# Altium footprint library Generic Footprint.PcbLib: 160 footprints (part 16 of 20) (continued)
## Symbol_FCC-Logo-6x4mm_Silkscreen [mil] (continued)
1(1.49,103.8) 1(1.49,104.07) 1(1.49,104.33) 1(1.49,104.6) 1(1.49,104.87) 1(1.49,105.14) 1(1.49,105.4) 1(1.49,105.67) 1(1.49,105.94) 1(1.49,106.21) 1(1.49,106.48) 1(1.49,106.74) 1(1.49,107.01) 1(1.49,107.28) 1(1.49,107.55) 1(1.49,107.81) 1(1.49,108.08) 1(1.49,108.35) 1(1.49,108.62) 1(1.49,108.88) 1(1.49,109.15) 1(1.49,109.42) 1(1.49,109.69) 1(1.49,109.96) 1(1.49,110.22) 1(1.49,110.49) 1(1.49,110.76) 1(1.49,111.03) 1(1.49,111.29) 1(1.49,111.56) 1(1.49,111.83) 1(1.49,112.1) 1(1.49,112.36) 1(1.49,112.63) 1(1.49,112.9) 1(1.49,113.17) 1(1.49,113.44) 1(1.49,113.7) 1(1.49,113.97) 1(1.49,114.24) 1(1.49,114.51) 1(1.49,114.77) 1(1.49,115.04) 1(1.49,115.31) 1(1.49,115.58) 1(1.49,115.85) 1(1.49,116.11) 1(1.49,116.38) 1(1.49,116.65) 1(1.49,116.92) 1(1.49,117.18) 1(1.49,117.45) 1(1.49,117.72) 1(1.49,117.99) 1(1.49,118.25) 1(1.49,118.52) 1(1.49,118.79) 1(1.49,119.06) 1(1.49,119.33) 1(1.49,119.59) 1(1.49,119.86) 1(1.49,120.13) 1(1.49,120.4) 1(1.49,120.66) 1(1.49,120.93) 1(1.49,121.2) 1(1.49,121.47) 1(1.49,121.74) 1(1.49,122) 1(1.49,122.27) 1(1.49,122.54) 1(1.49,122.81) 1(1.49,123.07) 1(1.49,123.34) 1(1.49,123.61) 1(1.49,123.88) 1(1.49,124.14) 1(1.49,124.41) 1(1.49,124.68) 1(1.49,124.95) 1(1.49,125.22) 1(1.49,125.48) 1(1.49,125.75) 1(1.49,126.02) 1(1.49,126.29) 1(1.49,126.55) 1(1.49,126.82) 1(1.49,127.09) 1(1.49,127.36) 1(1.49,127.62) 1(1.49,127.89) 1(1.49,128.16) 1(1.49,128.43) 1(1.49,128.7) 1(1.49,128.96) 1(1.49,129.23) 1(1.49,129.5) 1(1.49,129.77) 1(1.49,130.03) 1(1.49,130.3) 1(1.49,130.57) 1(1.49,130.84) 1(1.49,131.11) 1(1.49,131.37) 1(1.49,131.64) 1(1.49,131.91) 1(1.49,132.18) 1(1.49,132.44) 1(1.49,132.71) 1(1.49,132.98) 1(1.49,133.25) 1(1.49,133.51) 1(1.49,133.78) 1(1.49,134.05) 1(1.49,134.32) 1(1.49,134.59) 1(1.49,134.85) 1(1.49,135.12) 1(1.49,135.39) 1(1.49,135.66) 1(1.49,135.92) 1(1.49,136.19) 1(1.49,136.46) 1(1.49,136.73) 1(1.49,136.99) 1(1.49,137.26) 1(1.49,137.53) 1(1.49,137.8) 1(1.49,138.07) 1(1.49,138.33) 1(1.49,138.6) 1(1.49,138.87) 1(1.49,139.14) 1(1.49,139.4) 1(1.49,139.67) 1(1.49,139.94) 1(1.49,140.21) 1(1.49,140.48) 1(1.49,140.74) 1(1.49,141.01) 1(1.49,141.28) 1(1.49,141.55) 1(1.49,141.81) 1(1.49,142.08) 1(1.49,142.35) 1(1.49,142.62) 1(1.49,142.88) 1(1.49,143.15) 1(1.49,143.42) 1(1.49,143.96) 1(1.49,144.22) 1(1.49,144.49) 1(1.49,144.76) 1(1.49,145.03) 1(1.49,145.29) 1(1.49,145.56) 1(1.49,145.83) 1(1.75,2.87) 1(1.75,3.14) 1(1.75,3.4) 1(1.75,3.94) 1(1.75,144.22) 1(1.75,144.49) 1(1.75,144.76) 1(1.75,145.03) 1(1.75,145.29) 1(1.75,145.56) 1(1.75,145.83) 1(1.75,146.36) 1(1.75,146.63) 1(1.75,146.9) 1(2.02,3.14) 1(2.02,3.4) 1(2.02,3.67) 1(2.02,145.29) 1(2.02,145.56) 1(2.02,145.83) 1(2.02,146.1) 1(2.02,146.36) 1(2.02,146.63) 1(2.02,146.9) 1(2.02,147.44) 1(2.02,148.24) 1(2.29,2.6) 1(2.29,2.87) 1(2.29,146.36) 1(2.29,146.63) 1(2.29,146.9) 1(2.29,147.17) 1(2.29,147.44) 1(2.29,147.97) 1(2.56,2.33) 1(2.56,2.6) 1(2.56,2.87) 1(2.56,148.24) 1(2.56,148.77) 1(2.56,149.04) 1(2.56,149.31) 1(2.83,147.44) 1(2.83,147.7) 1(2.83,149.58) 1(3.09,2.07) 1(3.09,148.24) 1(3.09,148.51) 1(3.09,149.85) 1(3.09,150.11) 1(3.09,150.38) 1(3.09,150.65) 1(3.36,2.33) 1(3.36,2.6) 1(3.36,150.11) 1(3.36,150.38) 1(3.36,150.65) 1(3.36,151.18) 1(3.63,1.8) 1(3.63,150.11) 1(3.63,150.38) 1(3.63,150.65) 1(3.63,151.18) 1(3.9,2.07) 1(3.9,2.33) 1(4.16,150.92) 1(4.16,151.18) 1(4.16,152.25) 1(4.43,1.53) 1(4.43,151.45) 1(4.43,151.72) 1(4.43,151.99) 1(4.43,152.25) 1(4.43,152.79) 1(4.43,153.06) 1(4.43,153.33) 1(4.43,153.59) 1(4.7,1.26) 1(4.7,1.8) 1(4.7,2.07) 1(4.7,152.25) 1(4.7,152.52) 1(4.7,152.79) 1(4.7,153.06) 1(4.7,153.86) 1(4.97,152.79) 1(4.97,153.06) 1(4.97,153.59) 1(4.97,153.86) 1(4.97,154.13) 1(5.24,153.59) 1(5.24,153.86) 1(5.24,154.4) 1(5.5,154.66) 1(5.5,154.93) 1(5.77,154.93) 1(5.77,155.2) 1(6.04,154.93) 1(6.04,155.2) 1(6.04,155.74) 1(6.04,156) 1(6.31,155.2) 1(6.31,155.74) 1(6.31,156) 1(6.31,156.54) 1(6.57,155.47) 1(6.57,156.27) 1(6.57,156.81) 1(6.84,155.74) 1(6.84,156) 1(6.84,156.27) 1(6.84,156.54) 1(7.11,156.27) 1(7.11,156.54) 1(7.11,157.07) 1(7.11,157.34) 1(7.11,157.61) 1(7.38,157.88) 1(7.64,158.14) 1(8.18,158.68) 1(8.18,158.95) 1(8.45,158.68) 1(8.45,158.95) 1(8.45,159.22) 1(8.72,158.41) 1(8.72,158.68) 1(8.72,159.22) 1(8.72,159.48) 1(8.98,158.95) 1(8.98,159.48) 1(8.98,159.75) 1(9.25,159.22) 1(9.25,159.48) 1(9.25,160.02) 1(9.52,159.75) 1(9.52,160.29) 1(9.79,159.75) 1(9.79,160.55) 1(10.05,160.82) 1(10.32,160.55) 1(10.32,161.09) 1(10.59,160.55) 1(10.59,160.82) 1(10.59,161.36) 1(10.86,160.82) 1(10.86,161.09) 1(10.86,161.62) 1(11.12,161.09) 1(11.12,161.36) 1(11.12,161.62) 1(11.12,161.89) 1(11.39,161.36) 1(11.39,161.89) 1(11.39,162.16) 1(11.66,161.62) 1(11.66,162.43) 1(11.93,161.89) 1(12.2,162.7) 1(12.46,162.96) 1(12.73,163.23) 1(13,162.96) 1(13.27,163.5) 1(13.53,162.96) 1(13.53,163.77) 1(13.8,164.03) 1(14.07,163.77) 1(14.07,164.03) 1(14.07,164.3) 1(14.61,163.77) 1(14.61,164.3) 1(14.61,164.57) 1(14.87,164.03) 1(15.41,164.3) 1(15.41,164.84) 1(15.68,165.11) 1(15.94,165.37) 1(16.75,165.11) 1(16.75,165.37) 1(16.75,165.64) 1(17.28,165.11) 1(17.28,165.37) 1(17.55,165.64) 1(17.55,165.91) 1(18.09,165.64) 1(18.09,165.91) 1(18.09,166.18) 1(19.16,165.91) 1(19.16,166.18) 1(19.16,166.44) 1(19.96,166.71) 1(20.23,166.18) 1(20.23,166.98) 1(20.49,166.44) 1(21.83,166.44) 1(22.1,167.25) 1(27.46,1.53) 1(27.46,2.6) 1(27.46,2.87) 1(27.46,3.14) 1(27.46,3.4) 1(27.46,3.67) 1(27.46,3.94) 1(27.46,4.21) 1(27.46,4.48) 1(27.46,4.74) 1(27.46,5.01) 1(27.46,5.28) 1(27.46,5.55) 1(27.46,5.81) 1(27.46,6.08) 1(27.46,6.35) 1(27.46,6.62) 1(27.46,6.88) 1(27.46,7.15) 1(27.46,7.42) 1(27.46,7.69) 1(27.46,7.96) 1(27.46,8.22) 1(27.46,8.49) 1(27.46,8.76) 1(27.46,9.03) 1(27.46,9.29) 1(27.46,9.56) 1(27.46,9.83) 1(27.46,10.1) 1(27.46,10.36) 1(27.46,10.63) 1(27.46,10.9) 1(27.46,11.17) 1(27.46,11.44) 1(27.46,11.7) 1(27.46,11.97) 1(27.46,12.24) 1(27.46,12.51) 1(27.46,12.77) 1(27.46,13.04) 1(27.46,13.31) 1(27.46,13.58) 1(27.46,13.85) 1(27.46,14.11) 1(27.46,14.38) 1(27.46,14.65) 1(27.46,14.92) 1(27.46,15.18) 1(27.46,15.45) 1(27.46,15.72) 1(27.46,15.99) 1(27.46,16.25) 1(27.46,16.52) 1(27.46,16.79) 1(27.46,17.06) 1(27.46,17.33) 1(27.46,17.59) 1(27.46,17.86) 1(27.46,18.13) 1(27.46,18.4) 1(27.46,18.66) 1(27.46,18.93) 1(27.46,19.2) 1(27.46,19.47) 1(27.46,19.73) 1(27.46,20) 1(27.46,20.27) 1(27.46,20.54) 1(27.46,20.81) 1(27.46,21.07) 1(27.46,21.34) 1(27.46,21.61) 1(27.46,21.88) 1(27.46,22.14) 1(27.46,22.41) 1(27.46,22.68) 1(27.46,22.95) 1(27.46,23.22) 1(27.46,23.48) 1(27.46,23.75) 1(27.46,24.02) 1(27.46,24.29) 1(27.46,24.55) 1(27.46,24.82) 1(27.46,25.09) 1(27.46,25.36) 1(27.46,25.62) 1(27.46,25.89) 1(27.46,26.16) 1(27.46,26.43) 1(27.46,26.7) 1(27.46,26.96) 1(27.46,27.23) 1(27.46,27.5) 1(27.46,27.77) 1(27.46,28.03) 1(27.46,28.3) 1(27.46,28.57) 1(27.46,28.84) 1(27.46,29.11) 1(27.46,29.37) 1(27.46,29.64) 1(27.46,29.91) 1(27.46,30.18) 1(27.46,30.44) 1(27.46,30.71) 1(27.46,30.98) 1(27.46,31.25) 1(27.46,31.51) 1(27.46,31.78) 1(27.46,32.05) 1(27.46,32.32) 1(27.46,32.59) 1(27.46,32.85) 1(27.46,33.12) 1(27.46,33.39) 1(27.46,33.66) 1(27.46,33.92) 1(27.46,34.19) 1(27.46,34.46) 1(27.46,34.73) 1(27.46,34.99) 1(27.46,35.26) 1(27.46,35.53) 1(27.46,35.8) 1(27.46,36.07) 1(27.46,36.33) 1(27.46,36.6) 1(27.46,36.87) 1(27.46,37.14) 1(27.46,37.4) 1(27.46,37.67) 1(27.46,37.94) 1(27.46,38.21) 1(27.46,38.48) 1(27.46,38.74) 1(27.46,39.01) 1(27.46,39.28) 1(27.46,39.55) 1(27.46,39.81) 1(27.46,40.08) 1(27.46,40.35) 1(27.46,40.62) 1(27.46,40.88) 1(27.46,41.15) 1(27.46,41.42) 1(27.46,41.69) 1(27.46,41.96) 1(27.46,42.22) 1(27.46,42.49) 1(27.46,42.76) 1(27.46,43.03) 1(27.46,43.29) 1(27.46,43.56) 1(27.46,43.83) 1(27.46,44.1) 1(27.46,44.36) 1(27.46,44.63) 1(27.46,44.9) 1(27.46,45.17) 1(27.46,45.44) 1(27.46,45.7) 1(27.46,45.97) 1(27.46,46.24) 1(27.46,46.51) 1(27.46,46.77) 1(27.46,47.04) 1(27.46,47.31) 1(27.46,47.58) 1(27.46,47.85) 1(27.46,48.11) 1(27.46,48.38) 1(27.46,48.65) 1(27.46,48.92) 1(27.46,49.18) 1(27.46,49.45) 1(27.46,49.72) 1(27.46,49.99) 1(27.46,50.25) 1(27.46,50.52) 1(27.46,50.79) 1(27.46,51.06) 1(27.46,51.33) 1(27.46,51.59) 1(27.46,51.86) 1(27.46,52.13) 1(27.46,52.4) 1(27.46,52.66) 1(27.46,52.93) 1(27.46,53.2) 1(27.46,53.47) 1(27.46,53.73) 1(27.46,54) 1(27.46,54.27) 1(27.46,54.54) 1(27.46,54.81) 1(27.46,55.07) 1(27.46,55.34) 1(27.46,55.61) 1(27.46,55.88) 1(27.46,56.14) 1(27.46,56.41) 1(27.46,56.68) 1(27.46,56.95) 1(27.46,57.22) 1(27.46,57.48) 1(27.46,57.75) 1(27.46,58.02) 1(27.46,58.29) 1(27.46,58.55) 1(27.46,58.82) 1(27.46,59.09) 1(27.46,59.36) 1(27.46,59.62) 1(27.46,59.89) 1(27.46,60.16) 1(27.46,60.43) 1(27.46,60.7) 1(27.46,60.96) 1(27.46,61.23) 1(27.46,61.5) 1(27.46,61.77) 1(27.46,62.03) 1(27.46,62.3) 1(27.46,62.57) 1(27.46,62.84) 1(27.46,63.11) 1(27.46,63.37) 1(27.46,63.64) 1(27.46,63.91) 1(27.46,64.18) 1(27.46,64.44) 1(27.46,64.71) 1(27.46,64.98) 1(27.46,65.25) 1(27.46,65.51) 1(27.46,65.78) 1(27.46,66.05) 1(27.46,66.32) 1(27.46,66.59) 1(27.46,66.85) 1(27.46,67.12) 1(27.46,67.39) 1(27.46,67.66) 1(27.46,67.92) 1(27.46,68.19) 1(27.46,68.46) 1(27.46,68.73) 1(27.46,68.99) 1(27.46,69.26) 1(27.46,69.53) 1(27.46,69.8) 1(27.46,70.33) 1(27.46,134.85) 1(27.46,135.12) 1(27.72,1.26) 1(27.72,2.6) 1(27.72,2.87) 1(27.72,3.14) 1(27.72,3.4) 1(27.72,3.67) 1(27.72,3.94) 1(27.72,4.21) 1(27.72,4.48) 1(27.72,4.74) 1(27.72,5.01) 1(27.72,5.28) 1(27.72,5.55) 1(27.72,5.81) 1(27.72,6.08) 1(27.72,6.35) 1(27.72,6.62) 1(27.72,6.88) 1(27.72,7.15) 1(27.72,7.42) 1(27.72,7.69) 1(27.72,7.96) 1(27.72,8.22) 1(27.72,8.49) 1(27.72,8.76) 1(27.72,9.03) 1(27.72,9.29) 1(27.72,9.56) 1(27.72,9.83) 1(27.72,10.1) 1(27.72,10.36) 1(27.72,10.63) 1(27.72,10.9) 1(27.72,11.17) 1(27.72,11.44) 1(27.72,11.7) 1(27.72,11.97) 1(27.72,12.24) 1(27.72,12.51) 1(27.72,12.77) 1(27.72,13.04) 1(27.72,13.31) 1(27.72,13.58) 1(27.72,13.85) 1(27.72,14.11) 1(27.72,14.38) 1(27.72,14.65) 1(27.72,14.92) 1(27.72,15.18) 1(27.72,15.45) 1(27.72,15.72) 1(27.72,15.99) 1(27.72,16.25) 1(27.72,16.52) 1(27.72,16.79) 1(27.72,17.06) 1(27.72,17.33) 1(27.72,17.59) 1(27.72,17.86) 1(27.72,18.13) 1(27.72,18.4) 1(27.72,18.66) 1(27.72,18.93) 1(27.72,19.2) 1(27.72,19.47) 1(27.72,19.73) 1(27.72,20) 1(27.72,20.27) 1(27.72,20.54) 1(27.72,20.81) 1(27.72,21.07) 1(27.72,21.34) 1(27.72,21.61) 1(27.72,21.88) 1(27.72,22.14) 1(27.72,22.41) 1(27.72,22.68) 1(27.72,22.95) 1(27.72,23.22) 1(27.72,23.48) 1(27.72,23.75) 1(27.72,24.02) 1(27.72,24.29) 1(27.72,24.55) 1(27.72,24.82) 1(27.72,25.09) 1(27.72,25.36) 1(27.72,25.62) 1(27.72,25.89) 1(27.72,26.16) 1(27.72,26.43) 1(27.72,26.7) 1(27.72,26.96) 1(27.72,27.23) 1(27.72,27.5) 1(27.72,27.77) 1(27.72,28.03) 1(27.72,28.3) 1(27.72,28.57) 1(27.72,28.84) 1(27.72,29.11) 1(27.72,29.37) 1(27.72,29.64) 1(27.72,29.91) 1(27.72,30.18) 1(27.72,30.44) 1(27.72,30.71) 1(27.72,30.98) 1(27.72,31.25) 1(27.72,31.51) 1(27.72,31.78) 1(27.72,32.05) 1(27.72,32.32) 1(27.72,32.59) 1(27.72,32.85) 1(27.72,33.12) 1(27.72,33.39) 1(27.72,33.66) 1(27.72,33.92) 1(27.72,34.19) 1(27.72,34.46) 1(27.72,34.73) 1(27.72,34.99) 1(27.72,35.26) 1(27.72,35.53) 1(27.72,35.8) 1(27.72,36.07) 1(27.72,36.33) 1(27.72,36.6) 1(27.72,36.87) 1(27.72,37.14) 1(27.72,37.4) 1(27.72,37.67) 1(27.72,37.94) 1(27.72,38.21) 1(27.72,38.48) 1(27.72,38.74) 1(27.72,39.01) 1(27.72,39.28) 1(27.72,39.55) 1(27.72,39.81) 1(27.72,40.08) 1(27.72,40.35) 1(27.72,40.62) 1(27.72,40.88) 1(27.72,41.15) 1(27.72,41.42) 1(27.72,41.69) 1(27.72,41.96) 1(27.72,42.22) 1(27.72,42.49) 1(27.72,42.76) 1(27.72,43.03) 1(27.72,43.29) 1(27.72,43.56) 1(27.72,43.83) 1(27.72,44.1) 1(27.72,44.36) 1(27.72,44.63) 1(27.72,44.9) 1(27.72,45.17) 1(27.72,45.44) 1(27.72,45.7) 1(27.72,45.97) 1(27.72,46.24) 1(27.72,46.51) 1(27.72,46.77) 1(27.72,47.04) 1(27.72,47.31) 1(27.72,47.58) 1(27.72,47.85) 1(27.72,48.11) 1(27.72,48.38) 1(27.72,48.65) 1(27.72,48.92) 1(27.72,49.18) 1(27.72,49.45) 1(27.72,49.72) 1(27.72,49.99) 1(27.72,50.25) 1(27.72,50.52) 1(27.72,50.79) 1(27.72,51.06) 1(27.72,51.33) 1(27.72,51.59) 1(27.72,51.86) 1(27.72,52.13) 1(27.72,52.4) 1(27.72,52.66) 1(27.72,52.93) 1(27.72,53.2) 1(27.72,53.47) 1(27.72,53.73) 1(27.72,54) 1(27.72,54.27) 1(27.72,54.54) 1(27.72,54.81) 1(27.72,55.07) 1(27.72,55.34) 1(27.72,55.61) 1(27.72,55.88) 1(27.72,56.14) 1(27.72,56.41) 1(27.72,56.68) 1(27.72,56.95) 1(27.72,57.22) 1(27.72,57.48) 1(27.72,57.75) 1(27.72,58.02) 1(27.72,58.29) 1(27.72,58.55) 1(27.72,58.82) 1(27.72,59.09) 1(27.72,59.36) 1(27.72,59.62) 1(27.72,59.89) 1(27.72,60.16) 1(27.72,60.43) 1(27.72,60.7) 1(27.72,60.96) 1(27.72,61.23) 1(27.72,61.5) 1(27.72,61.77) 1(27.72,62.03) 1(27.72,62.3) 1(27.72,62.57) 1(27.72,62.84) 1(27.72,63.11) 1(27.72,63.37) 1(27.72,63.64) 1(27.72,63.91) 1(27.72,64.18) 1(27.72,64.44) 1(27.72,64.71) 1(27.72,64.98) 1(27.72,65.25) 1(27.72,65.51) 1(27.72,65.78) 1(27.72,66.05) 1(27.72,66.32) 1(27.72,66.59) 1(27.72,66.85) 1(27.72,67.12) 1(27.72,67.39) 1(27.72,67.66) 1(27.72,67.92) 1(27.72,68.19) 1(27.72,68.46) 1(27.72,68.73) 1(27.72,68.99) 1(27.72,69.26) 1(27.72,69.53) 1(27.72,69.8) 1(27.72,70.33) 1(27.72,71.14) 1(27.72,134.85) 1(27.72,135.12) 1(27.72,135.39) 1(27.72,135.66) 1(27.99,1.8) 1(27.99,2.07) 1(27.99,70.87) 1(27.99,92.82) 1(27.99,93.09) 1(27.99,93.36) 1(27.99,93.62) 1(27.99,93.89) 1(27.99,94.16) 1(27.99,94.43) 1(27.99,94.7) 1(27.99,94.96) 1(27.99,95.23) 1(27.99,95.5) 1(27.99,95.77) 1(27.99,96.03) 1(27.99,96.3) 1(27.99,96.57) 1(27.99,96.84) 1(27.99,97.11) 1(27.99,97.37) 1(27.99,97.64) 1(27.99,97.91) 1(27.99,98.18) 1(27.99,98.44) 1(27.99,98.71) 1(27.99,98.98) 1(27.99,99.25) 1(27.99,99.51) 1(27.99,99.78) 1(27.99,100.05) 1(27.99,100.32) 1(27.99,100.59) 1(27.99,100.85) 1(27.99,101.12) 1(27.99,101.39) 1(27.99,101.66) 1(27.99,101.92) 1(27.99,102.19) 1(27.99,102.46) 1(27.99,102.73) 1(27.99,102.99) 1(27.99,103.26) 1(27.99,103.53) 1(27.99,103.8) 1(27.99,104.07) 1(27.99,104.33) 1(27.99,104.6) 1(27.99,104.87) 1(27.99,105.14) 1(27.99,105.4) 1(27.99,105.67) 1(27.99,105.94) 1(27.99,106.21) 1(27.99,106.48) 1(27.99,106.74) 1(27.99,107.01) 1(27.99,107.28) 1(27.99,107.55) 1(27.99,107.81) 1(27.99,108.08) 1(27.99,108.35) 1(27.99,108.62) 1(27.99,108.88) 1(27.99,109.15) 1(27.99,109.42) 1(27.99,109.69) 1(27.99,109.96) 1(27.99,110.22) 1(27.99,110.49) 1(27.99,110.76) 1(27.99,111.03) 1(27.99,111.29) 1(27.99,111.56) 1(27.99,111.83) 1(27.99,112.1) 1(27.99,112.36) 1(27.99,112.63) 1(27.99,112.9) 1(27.99,113.17) 1(27.99,113.44) 1(27.99,113.7) 1(27.99,113.97) 1(27.99,114.24) 1(27.99,114.51) 1(27.99,114.77) 1(27.99,115.04) 1(27.99,115.31) 1(27.99,115.58) 1(27.99,115.85) 1(27.99,116.11) 1(27.99,116.38) 1(27.99,116.65) 1(27.99,116.92) 1(27.99,117.18) 1(27.99,117.45) 1(27.99,117.72) 1(27.99,117.99) 1(27.99,118.25) 1(27.99,118.52) 1(27.99,118.79) 1(27.99,119.06) 1(27.99,119.33) 1(27.99,119.59) 1(27.99,119.86) 1(27.99,120.13) 1(27.99,120.4) 1(27.99,120.66) 1(27.99,120.93) 1(27.99,121.2) 1(27.99,121.47) 1(27.99,121.74) 1(27.99,122) 1(27.99,122.27) 1(27.99,122.54) 1(27.99,122.81) 1(27.99,123.07) 1(27.99,123.34) 1(27.99,123.61) 1(27.99,123.88) 1(27.99,124.14) 1(27.99,124.41) 1(27.99,124.68) 1(27.99,124.95) 1(27.99,125.22) 1(27.99,125.48) 1(27.99,125.75) 1(27.99,126.02) 1(27.99,126.29) 1(27.99,126.55) 1(27.99,126.82) 1(27.99,127.09) 1(27.99,127.36) 1(27.99,127.62) 1(27.99,127.89) 1(27.99,128.16) 1(27.99,128.43) 1(27.99,128.7) 1(27.99,128.96) 1(27.99,129.23) 1(27.99,129.5) 1(27.99,129.77) 1(27.99,130.03) 1(27.99,130.3) 1(27.99,130.57) 1(27.99,130.84) 1(27.99,131.11) 1(27.99,131.37) 1(27.99,131.64) 1(27.99,131.91) 1(27.99,132.18) 1(27.99,132.44) 1(27.99,132.71) 1(27.99,132.98) 1(27.99,133.25) 1(27.99,133.51) 1(27.99,133.78) 1(27.99,134.05) 1(27.99,134.32) 1(27.99,134.59) 1(27.99,135.12) 1(28.26,1.8) 1(28.26,2.33) 1(28.26,2.6) 1(28.26,2.87) 1(28.26,3.14) 1(28.26,3.4) 1(28.26,3.67) 1(28.26,3.94) 1(28.26,4.21) 1(28.26,4.48) 1(28.26,4.74) 1(28.26,5.01) 1(28.26,5.28) 1(28.26,5.55) 1(28.26,5.81) 1(28.26,6.08) 1(28.26,6.35) 1(28.26,6.62) 1(28.26,6.88) 1(28.26,7.15) 1(28.26,7.42) 1(28.26,7.69) 1(28.26,7.96) 1(28.26,8.22) 1(28.26,8.49) 1(28.26,8.76) 1(28.26,9.03) 1(28.26,9.29) 1(28.26,9.56) 1(28.26,9.83) 1(28.26,10.1) 1(28.26,10.36) 1(28.26,10.63) 1(28.26,10.9) 1(28.26,11.17) 1(28.26,11.44) 1(28.26,11.7) 1(28.26,11.97) 1(28.26,12.24) 1(28.26,12.51) 1(28.26,12.77) 1(28.26,13.04) 1(28.26,13.31) 1(28.26,13.58) 1(28.26,13.85) 1(28.26,14.11) 1(28.26,14.38) 1(28.26,14.65) 1(28.26,14.92) 1(28.26,15.18) 1(28.26,15.45) 1(28.26,15.72) 1(28.26,15.99) 1(28.26,16.25) 1(28.26,16.52) 1(28.26,16.79) 1(28.26,17.06) 1(28.26,17.33) 1(28.26,17.59) 1(28.26,17.86) 1(28.26,18.13) 1(28.26,18.4) 1(28.26,18.66) 1(28.26,18.93) 1(28.26,19.2) 1(28.26,19.47) 1(28.26,19.73) 1(28.26,20) 1(28.26,20.27) 1(28.26,20.54) 1(28.26,20.81) 1(28.26,21.07) 1(28.26,21.34) 1(28.26,21.61) 1(28.26,21.88) 1(28.26,22.14) 1(28.26,22.41) 1(28.26,22.68) 1(28.26,22.95) 1(28.26,23.22) 1(28.26,23.48) 1(28.26,23.75) 1(28.26,24.02) 1(28.26,24.29) 1(28.26,24.55) 1(28.26,24.82) 1(28.26,25.09) 1(28.26,25.36) 1(28.26,25.62) 1(28.26,25.89) 1(28.26,26.16) 1(28.26,26.43) 1(28.26,26.7) 1(28.26,26.96) 1(28.26,27.23) 1(28.26,27.5) 1(28.26,27.77) 1(28.26,28.03) 1(28.26,28.3) 1(28.26,28.57) 1(28.26,28.84) 1(28.26,29.11) 1(28.26,29.37) 1(28.26,29.64) 1(28.26,29.91) 1(28.26,30.18) 1(28.26,30.44) 1(28.26,30.71) 1(28.26,30.98) 1(28.26,31.25) 1(28.26,31.51) 1(28.26,31.78) 1(28.26,32.05) 1(28.26,32.32) 1(28.26,32.59) 1(28.26,32.85) 1(28.26,33.12) 1(28.26,33.39) 1(28.26,33.66) 1(28.26,33.92) 1(28.26,34.19) 1(28.26,34.46) 1(28.26,34.73) 1(28.26,34.99) 1(28.26,35.26) 1(28.26,35.53) 1(28.26,35.8) 1(28.26,36.07) 1(28.26,36.33) 1(28.26,36.6) 1(28.26,36.87) 1(28.26,37.14) 1(28.26,37.4) 1(28.26,37.67) 1(28.26,37.94) 1(28.26,38.21) 1(28.26,38.48) 1(28.26,38.74) 1(28.26,39.01) 1(28.26,39.28) 1(28.26,39.55) 1(28.26,39.81) 1(28.26,40.08) 1(28.26,40.35) 1(28.26,40.62) 1(28.26,40.88) 1(28.26,41.15) 1(28.26,41.42) 1(28.26,41.69) 1(28.26,41.96) 1(28.26,42.22) 1(28.26,42.49) 1(28.26,42.76) 1(28.26,43.03) 1(28.26,43.29) 1(28.26,43.56) 1(28.26,43.83) 1(28.26,44.1) 1(28.26,44.36) 1(28.26,44.63) 1(28.26,44.9) 1(28.26,45.17) 1(28.26,45.44) 1(28.26,45.7) 1(28.26,45.97) 1(28.26,46.24) 1(28.26,46.51) 1(28.26,46.77) 1(28.26,47.04) 1(28.26,47.31) 1(28.26,47.58) 1(28.26,47.85) 1(28.26,48.11) 1(28.26,48.38) 1(28.26,48.65) 1(28.26,48.92) 1(28.26,49.18) 1(28.26,49.45) 1(28.26,49.72) 1(28.26,49.99) 1(28.26,50.25) 1(28.26,50.52) 1(28.26,50.79) 1(28.26,51.06) 1(28.26,51.33) 1(28.26,51.59) 1(28.26,51.86) 1(28.26,52.13) 1(28.26,52.4) 1(28.26,52.66) 1(28.26,52.93) 1(28.26,53.2) 1(28.26,53.47) 1(28.26,53.73) 1(28.26,54) 1(28.26,54.27) 1(28.26,54.54) 1(28.26,54.81) 1(28.26,55.07) 1(28.26,55.34) 1(28.26,55.61) 1(28.26,55.88) 1(28.26,56.14) 1(28.26,56.41) 1(28.26,56.68) 1(28.26,56.95) 1(28.26,57.22) 1(28.26,57.48) 1(28.26,57.75) 1(28.26,58.02) 1(28.26,58.29) 1(28.26,58.55) 1(28.26,58.82) 1(28.26,59.09) 1(28.26,59.36) 1(28.26,59.62) 1(28.26,59.89) 1(28.26,60.16) 1(28.26,60.43) 1(28.26,60.7) 1(28.26,60.96) 1(28.26,61.23) 1(28.26,61.5) 1(28.26,61.77) 1(28.26,62.03) 1(28.26,62.3) 1(28.26,62.57) 1(28.26,62.84) 1(28.26,63.11) 1(28.26,63.37) 1(28.26,63.64) 1(28.26,63.91) 1(28.26,64.18) 1(28.26,64.44) 1(28.26,64.71) 1(28.26,64.98) 1(28.26,65.25) 1(28.26,65.51) 1(28.26,65.78) 1(28.26,66.05) 1(28.26,66.32) 1(28.26,66.59) 1(28.26,66.85) 1(28.26,67.12) 1(28.26,67.39) 1(28.26,67.66) 1(28.26,67.92) 1(28.26,68.19) 1(28.26,68.46) 1(28.26,68.73) 1(28.26,68.99) 1(28.26,69.26) 1(28.26,69.53) 1(28.26,69.8) 1(28.26,70.07) 1(28.26,70.33) 1(28.26,70.6) 1(28.26,71.14) 1(28.26,92.29) 1(28.26,134.85) 1(28.26,135.12) 1(28.26,135.39) 1(28.26,135.66) 1(28.26,135.92) 1(28.26,136.19) 1(28.53,71.14) 1(28.53,71.4) 1(28.53,71.67) 1(28.53,92.29) 1(28.53,135.12) 1(28.53,135.39) 1(28.53,135.66) 1(28.53,136.46) 1(28.79,72.21) 1(28.79,92.02) 1(28.79,92.55) 1(28.79,136.19) 1(28.79,136.46) 1(28.79,136.99) 1(29.06,136.19) 1(29.06,136.46) 1(29.06,136.73) 1(29.06,136.99) 1(29.33,137.53) 1(29.6,136.99) 1(29.6,137.53) 1(29.6,137.8) 1(29.86,71.67) 1(29.86,71.94) 1(29.86,72.21) 1(29.86,137.26) 1(29.86,137.8) 1(30.13,138.07) 1(30.4,137.53) 1(30.4,138.07) 1(30.67,137.8) 1(30.94,138.07) 1(31.2,138.33) 1(31.2,138.87) 1(31.74,138.6) 1(31.74,138.87) 1(31.74,139.14) 1(32.27,138.87) 1(32.27,139.14) 1(32.27,139.4) 1(80.2,92.02) 1(80.2,92.55) 1(80.46,71.94) 1(80.73,69.53) 1(80.73,69.8) 1(80.73,70.07) 1(80.73,70.33) 1(80.73,70.6) 1(80.73,70.87) 1(80.73,71.14) 1(80.73,71.4) 1(80.73,92.55) 1(80.73,93.36) 1(80.73,93.62) 1(80.73,93.89) 1(80.73,94.16) 1(80.73,94.43) 1(80.73,94.7) 1(81,67.66) 1(81,67.92) 1(81,68.19) 1(81,68.46) 1(81,68.73) 1(81,68.99) 1(81,69.53) 1(81,69.8) 1(81,70.07) 1(81,70.33) 1(81,70.6) 1(81,70.87) 1(81,71.14) 1(81,92.55) 1(81,92.82) 1(81,93.36) 1(81,93.62) 1(81,93.89) 1(81,94.16) 1(81,94.43) 1(81,94.7) 1(81,95.23) 1(81,95.5) 1(81,95.77) 1(81,96.03) 1(81,96.3) 1(81.27,66.32) 1(81.27,66.59) 1(81.27,66.85) 1(81.27,67.12) 1(81.27,67.66) 1(81.27,67.92) 1(81.27,68.19) 1(81.27,68.46) 1(81.27,68.73) 1(81.27,68.99) 1(81.27,69.26) 1(81.27,69.53) 1(81.27,69.8) 1(81.27,70.07) 1(81.27,70.33) 1(81.27,70.6) 1(81.27,70.87) 1(81.27,71.14) 1(81.27,93.09) 1(81.27,93.36) 1(81.27,93.62) 1(81.27,93.89) 1(81.27,94.16) 1(81.27,94.43) 1(81.27,94.7) 1(81.27,94.96) 1(81.27,95.23) 1(81.27,95.5) 1(81.27,95.77) 1(81.27,96.03) 1(81.27,96.3) 1(81.27,96.84) 1(81.27,97.11) 1(81.27,97.37) 1(81.27,97.64) 1(81.27,97.91) 1(81.53,65.25) 1(81.53,65.78) 1(81.53,68.99) 1(81.53,95.23) 1(81.53,97.91) 1(81.53,98.18) 1(81.53,99.25) 1(81.8,63.64) 1(81.8,63.91) 1(81.8,64.18) 1(81.8,64.44) 1(81.8,64.71) 1(81.8,64.98) 1(81.8,65.51) 1(81.8,66.32) 1(81.8,66.59) 1(81.8,66.85) 1(81.8,67.12) 1(81.8,67.39) 1(81.8,67.66) 1(81.8,67.92) 1(81.8,68.19) 1(81.8,68.46) 1(81.8,68.73) 1(81.8,95.5) 1(81.8,95.77) 1(81.8,96.03) 1(81.8,96.3) 1(81.8,96.57) 1(81.8,96.84) 1(81.8,97.11) 1(81.8,97.37) 1(81.8,97.64) 1(81.8,98.18) 1(81.8,98.44) 1(81.8,98.71) 1(81.8,98.98) 1(81.8,99.51) 1(81.8,99.78) 1(81.8,100.05) 1(81.8,100.32) 1(81.8,100.59) 1(82.07,62.57) 1(82.07,62.84) 1(82.07,63.11) 1(82.07,63.37) 1(82.07,64.98) 1(82.07,65.25) 1(82.07,65.51) 1(82.07,65.78) 1(82.07,66.05) 1(82.07,66.32) 1(82.07,66.59) 1(82.07,66.85) 1(82.07,67.12) 1(82.07,96.84) 1(82.07,97.11) 1(82.07,97.37) 1(82.07,97.64) 1(82.07,97.91) 1(82.07,98.18) 1(82.07,98.44) 1(82.07,98.71) 1(82.07,98.98) 1(82.07,99.25) 1(82.07,99.51) 1(82.07,100.85) 1(82.07,101.12) 1(82.07,101.39) 1(82.07,101.66) 1(82.34,61.23) 1(82.34,61.5) 1(82.34,61.77) 1(82.34,62.03) 1(82.34,62.3) 1(82.34,63.64) 1(82.34,64.44) 1(82.34,64.98) 1(82.34,65.25) 1(82.34,65.51) 1(82.34,65.78) 1(82.34,98.44) 1(82.34,98.71) 1(82.34,98.98) 1(82.34,99.25) 1(82.34,99.51) 1(82.34,100.05) 1(82.34,100.32) 1(82.34,100.59) 1(82.34,101.92) 1(82.34,102.19) 1(82.34,102.46) 1(82.34,102.73) 1(82.34,102.99) 1(82.61,63.64) 1(82.61,64.44) 1(82.61,100.05) 1(82.61,100.32) 1(82.61,100.59) 1(82.87,60.43) 1(82.87,60.7) 1(82.87,60.96) 1(82.87,103.26) 1(82.87,103.53) 1(82.87,103.8) 1(83.14,59.09) 1(83.14,59.36) 1(83.14,59.62) 1(83.14,59.89) 1(83.14,60.43) 1(83.14,60.7) 1(83.14,103.53) 1(83.14,103.8) 1(83.14,104.33) 1(83.14,104.6) 1(83.14,104.87) 1(83.14,105.14) 1(83.41,58.29) 1(83.41,58.55) 1(83.41,59.09) 1(83.41,59.36) 1(83.41,59.62) 1(83.41,59.89) 1(83.41,60.16) 1(83.41,60.43) 1(83.41,60.7) 1(83.41,103.53) 1(83.41,103.8) 1(83.41,104.33) 1(83.41,104.6) 1(83.41,104.87) 1(83.41,105.14) 1(83.41,105.67) 1(83.68,57.48) 1(83.68,57.75) 1(83.68,58.29) 1(83.68,58.55) 1(83.68,59.09) 1(83.68,59.36) 1(83.68,59.62) 1(83.68,59.89) 1(83.68,104.07) 1(83.68,104.33) 1(83.68,104.6) 1(83.68,104.87) 1(83.68,105.14) 1(83.68,105.67) 1(83.68,106.21) 1(83.68,106.48) 1(83.68,106.74) 1(83.94,56.41) 1(83.94,56.68) 1(83.94,56.95) 1(83.94,57.48) 1(83.94,57.75) 1(83.94,58.29) 1(83.94,58.55) 1(83.94,58.82) 1(83.94,105.4) 1(83.94,105.67) 1(83.94,105.94) 1(83.94,106.21) 1(83.94,106.48) 1(83.94,106.74) 1(83.94,107.28) 1(83.94,107.55) 1(84.21,55.88) 1(84.21,56.14) 1(84.21,58.02) 1(84.21,106.21) 1(84.21,107.01) 1(84.21,107.55) 1(84.21,107.81) 1(84.21,108.08) 1(84.21,108.35) 1(84.48,54.81) 1(84.48,55.07) 1(84.48,55.34) 1(84.48,55.61) 1(84.48,56.41) 1(84.48,56.68) 1(84.48,57.22) 1(84.48,57.48) 1(84.48,57.75) 1(84.48,106.48) 1(84.48,106.74) 1(84.48,107.28) 1(84.48,108.62) 1(84.48,108.88) 1(84.48,109.15) 1(84.48,109.42) 1(84.48,166.98) 1(84.75,53.73) 1(84.75,54) 1(84.75,54.27) 1(84.75,54.54) 1(84.75,55.61) 1(84.75,55.88) 1(84.75,56.41) 1(84.75,56.68) 1(84.75,107.28) 1(84.75,107.55) 1(84.75,108.08) 1(84.75,108.35) 1(84.75,108.62) 1(84.75,109.69) 1(84.75,109.96) 1(84.75,110.22) 1(84.75,166.44) 1(84.75,166.71) 1(84.75,166.98) 1(85.01,53.47) 1(85.01,53.73) 1(85.01,54) 1(85.01,55.61) 1(85.01,55.88) 1(85.01,108.08) 1(85.01,108.35) 1(85.01,108.62) 1(85.01,110.22) 1(85.01,110.49) 1(85.01,110.76) 1(85.01,139.94) 1(85.01,140.21) 1(85.01,140.48) 1(85.01,140.74) 1(85.01,141.01) 1(85.01,141.28) 1(85.01,141.55) 1(85.01,141.81) 1(85.01,142.08) 1(85.01,142.35) 1(85.01,142.62) 1(85.01,142.88) 1(85.01,143.15) 1(85.01,143.42) 1(85.01,143.69) 1(85.01,143.96) 1(85.01,144.22) 1(85.01,144.49) 1(85.01,144.76) 1(85.01,145.03) 1(85.01,145.29) 1(85.01,145.56) 1(85.01,145.83) 1(85.01,146.1) 1(85.01,146.36) 1(85.01,146.63) 1(85.01,146.9) 1(85.01,147.17) 1(85.01,147.44) 1(85.01,147.7) 1(85.01,147.97) 1(85.01,148.24) 1(85.01,148.51) 1(85.01,148.77) 1(85.01,149.04) 1(85.01,149.31) 1(85.01,149.58) 1(85.01,149.85) 1(85.01,150.11) 1(85.01,150.38) 1(85.01,150.65) 1(85.01,150.92) 1(85.01,151.18) 1(85.01,151.45) 1(85.01,151.72) 1(85.01,151.99) 1(85.01,152.25) 1(85.01,152.52) 1(85.01,152.79) 1(85.01,153.06) 1(85.01,153.33) 1(85.01,153.59) 1(85.01,153.86) 1(85.01,154.13) 1(85.01,154.4) 1(85.01,154.66) 1(85.01,154.93) 1(85.01,155.2) 1(85.01,155.47) 1(85.01,155.74) 1(85.01,156) 1(85.01,156.27) 1(85.01,156.54) 1(85.01,156.81) 1(85.01,157.07) 1(85.01,157.34) 1(85.01,157.61) 1(85.01,157.88) 1(85.01,158.14) 1(85.01,158.41) 1(85.01,158.68) 1(85.01,158.95) 1(85.01,159.22) 1(85.01,159.48) 1(85.01,159.75) 1(85.01,160.02) 1(85.01,160.29) 1(85.01,160.55) 1(85.01,160.82) 1(85.01,161.09) 1(85.01,161.36) 1(85.01,161.62) 1(85.01,161.89) 1(85.01,162.16) 1(85.01,162.43) 1(85.01,162.7) 1(85.01,162.96) 1(85.01,163.23) 1(85.01,163.5) 1(85.01,163.77) 1(85.01,164.03) 1(85.01,164.3) 1(85.01,164.57) 1(85.01,164.84) 1(85.01,165.11) 1(85.01,165.37) 1(85.01,165.64) 1(85.01,165.91) 1(85.01,166.18) 1(85.01,166.44) 1(85.01,166.71) 1(85.01,166.98) 1(85.01,167.25) 1(85.28,53.47) 1(85.28,53.73) 1(85.28,54) 1(85.28,110.22) 1(85.28,110.76) 1(85.28,111.56) 1(85.28,139.94) 1(85.28,140.21) 1(85.28,140.48) 1(85.28,140.74) 1(85.28,141.01) 1(85.28,141.28) 1(85.28,141.55) 1(85.28,141.81) 1(85.28,142.08) 1(85.28,142.35) 1(85.28,142.62) 1(85.28,142.88) 1(85.28,143.15) 1(85.28,143.42) 1(85.28,143.69) 1(85.28,143.96) 1(85.28,144.22) 1(85.28,144.49) 1(85.28,144.76) 1(85.28,145.03) 1(85.28,145.29) 1(85.28,145.56) 1(85.28,145.83) 1(85.28,146.1) 1(85.28,146.36) 1(85.28,146.63) 1(85.28,146.9) 1(85.28,147.17) 1(85.28,147.44) 1(85.28,147.7) 1(85.28,147.97) 1(85.28,148.24) 1(85.28,148.51) 1(85.28,148.77) 1(85.28,149.04) 1(85.28,149.31) 1(85.28,149.58) 1(85.28,149.85) 1(85.28,150.11) 1(85.28,150.38) 1(85.28,150.65) 1(85.28,150.92) 1(85.28,151.18) 1(85.28,151.45) 1(85.28,151.72) 1(85.28,151.99) 1(85.28,152.25) 1(85.28,152.52) 1(85.28,152.79) 1(85.28,153.06) 1(85.28,153.33) 1(85.28,153.59) 1(85.28,153.86) 1(85.28,154.13) 1(85.28,154.4) 1(85.28,154.66) 1(85.28,154.93) 1(85.28,155.2) 1(85.28,155.47) 1(85.28,155.74) 1(85.28,156) 1(85.28,156.27) 1(85.28,156.54) 1(85.28,156.81) 1(85.28,157.07) 1(85.28,157.34) 1(85.28,157.61) 1(85.28,157.88) 1(85.28,158.14) 1(85.28,158.41) 1(85.28,158.68) 1(85.28,158.95) 1(85.28,159.22) 1(85.28,159.48) 1(85.28,159.75) 1(85.28,160.02) 1(85.28,160.29) 1(85.28,160.55) 1(85.28,160.82) 1(85.28,161.09) 1(85.28,161.36) 1(85.28,161.62) 1(85.28,161.89) 1(85.28,162.16) 1(85.28,162.43) 1(85.28,162.7) 1(85.28,162.96) 1(85.28,163.23) 1(85.28,163.5) 1(85.28,163.77) 1(85.28,164.03) 1(85.28,164.3) 1(85.28,164.57) 1(85.28,164.84) 1(85.28,165.11) 1(85.28,165.37) 1(85.28,165.64) 1(85.28,165.91) 1(85.28,166.44) 1(85.28,166.71) 1(85.55,52.4) 1(85.55,52.66) 1(85.55,52.93) 1(85.55,111.29) 1(85.55,111.83) 1(85.55,139.94) 1(85.55,140.21) 1(85.55,140.48) 1(85.55,140.74) 1(85.55,141.01) 1(85.55,141.28) 1(85.55,141.55) 1(85.55,141.81) 1(85.55,142.08) 1(85.55,142.35) 1(85.55,142.62) 1(85.55,142.88) 1(85.55,143.15) 1(85.55,143.42) 1(85.55,143.69) 1(85.55,143.96) 1(85.55,144.22) 1(85.55,144.49) 1(85.55,144.76) 1(85.55,145.03) 1(85.55,145.29) 1(85.55,145.56) 1(85.55,145.83) 1(85.55,146.1) 1(85.55,146.36) 1(85.55,146.63) 1(85.55,146.9) 1(85.55,147.17) 1(85.55,147.44) 1(85.55,147.7) 1(85.55,147.97) 1(85.55,148.24) 1(85.55,148.51) 1(85.55,148.77) 1(85.55,149.04) 1(85.55,149.31) 1(85.55,149.58) 1(85.55,149.85) 1(85.55,150.11) 1(85.55,150.38) 1(85.55,150.65) 1(85.55,150.92) 1(85.55,151.18) 1(85.55,151.45) 1(85.55,151.72) 1(85.55,151.99) 1(85.55,152.25) 1(85.55,152.52) 1(85.55,152.79) 1(85.55,153.06) 1(85.55,153.33) 1(85.55,153.59) 1(85.55,153.86) 1(85.55,154.13) 1(85.55,154.4) 1(85.55,154.66) 1(85.55,154.93) 1(85.55,155.2) 1(85.55,155.47) 1(85.55,155.74) 1(85.55,156) 1(85.55,156.27) 1(85.55,156.54) 1(85.55,156.81) 1(85.55,157.07) 1(85.55,157.34) 1(85.55,157.61) 1(85.55,157.88) 1(85.55,158.14) 1(85.55,158.41) 1(85.55,158.68) 1(85.55,158.95) 1(85.55,159.22) 1(85.55,159.48) 1(85.55,159.75) 1(85.55,160.02) 1(85.55,160.29) 1(85.55,160.55) 1(85.55,160.82) 1(85.55,161.09) 1(85.55,161.36) 1(85.55,161.62) 1(85.55,161.89) 1(85.55,162.16) 1(85.55,162.43) 1(85.55,162.7) 1(85.55,162.96) 1(85.55,163.23) 1(85.55,163.5) 1(85.55,163.77) 1(85.55,164.03) 1(85.55,164.3) 1(85.55,164.57) 1(85.55,164.84) 1(85.55,165.11) 1(85.55,165.37) 1(85.55,165.64) 1(85.82,51.86) 1(85.82,52.4) 1(85.82,52.66) 1(85.82,52.93) 1(85.82,53.2) 1(85.82,53.47) 1(85.82,110.76) 1(85.82,111.03) 1(85.82,111.29) 1(85.82,111.56) 1(85.82,111.83) 1(85.82,112.36) 1(85.82,139.4) 1(85.82,139.67) 1(85.82,165.91) 1(86.09,50.52) 1(86.09,51.06) 1(86.09,51.33) 1(86.09,51.86) 1(86.09,52.4) 1(86.09,52.66) 1(86.09,52.93) 1(86.09,111.29) 1(86.09,111.56) 1(86.09,111.83) 1(86.09,112.36) 1(86.09,112.9) 1(86.09,113.17) 1(86.09,139.4) 1(86.35,49.99) 1(86.35,51.06) 1(86.35,51.33) 1(86.35,51.86) 1(86.35,52.13) 1(86.35,112.1) 1(86.35,112.36) 1(86.35,112.9) 1(86.35,113.17) 1(86.35,113.7) 1(86.35,114.51) 1(86.35,139.14) 1(86.62,49.72) 1(86.62,50.52) 1(86.62,50.79) 1(86.62,51.06) 1(86.62,51.33) 1(86.62,51.59) 1(86.62,112.63) 1(86.62,112.9) 1(86.62,113.17) 1(86.62,113.44) 1(86.62,113.7) 1(86.62,114.24) 1(86.62,115.04) 1(86.89,48.92) 1(86.89,49.18) 1(86.89,49.45) 1(86.89,114.77) 1(87.16,48.38) 1(87.16,48.65) 1(87.16,50.25) 1(87.16,50.52) 1(87.16,113.7) 1(87.16,113.97) 1(87.16,115.31) 1(87.16,115.58) 1(87.16,115.85) 1(87.42,47.85) 1(87.42,48.11) 1(87.42,48.38) 1(87.42,115.85) 1(87.42,116.11) 1(87.42,116.38) 1(87.69,47.04) 1(87.69,47.31) 1(87.69,47.85) 1(87.69,48.11) 1(87.69,48.38) 1(87.69,115.85) 1(87.69,116.11) 1(87.69,116.38) 1(87.69,116.92) 1(87.96,46.77) 1(87.96,47.04) 1(87.96,47.31) 1(87.96,47.58) 1(87.96,47.85) 1(87.96,48.11) 1(87.96,116.11) 1(87.96,116.38) 1(87.96,116.92) 1(87.96,117.45) 1(88.23,116.65) 1(88.49,45.44) 1(88.49,45.97) 1(88.49,46.77) 1(88.49,47.04) 1(88.49,47.31) 1(88.49,116.92) 1(88.49,117.18) 1(88.49,117.45) 1(88.49,117.99) 1(88.49,118.25) 1(88.76,44.9) 1(88.76,45.17) 1(88.76,45.97) 1(88.76,46.51) 1(88.76,46.77) 1(88.76,117.45) 1(88.76,117.72) 1(88.76,117.99) 1(88.76,118.25) 1(88.76,118.79) 1(88.76,119.06) 1(89.03,44.36) 1(89.03,44.63) 1(89.03,45.17) 1(89.03,45.44) 1(89.03,45.97) 1(89.03,46.24) 1(89.03,117.99) 1(89.03,118.25) 1(89.03,118.79) 1(89.03,119.06) 1(89.03,119.33) 1(89.03,119.59) 1(89.03,119.86) 1(89.3,43.83) 1(89.3,45.17) 1(89.3,45.44) 1(89.3,45.7) 1(89.3,118.52) 1(89.3,118.79) 1(89.3,119.06) 1(89.3,120.4) 1(89.57,44.1) 1(89.57,120.13) 1(89.83,43.03) 1(89.83,43.29) 1(89.83,43.56) 1(89.83,120.66) 1(89.83,120.93) 1(89.83,121.2) 1(90.1,42.76) 1(90.1,43.03) 1(90.1,43.29) 1(90.1,120.66) 1(90.1,120.93) 1(90.1,121.47) 1(90.37,42.22) 1(90.37,42.76) 1(90.37,43.03) 1(90.37,43.29) 1(90.37,120.66) 1(90.37,120.93) 1(90.37,121.47) 1(90.64,41.69) 1(90.64,42.22) 1(90.64,42.76) 1(90.64,121.47) 1(90.64,122.54) 1(90.9,40.88) 1(90.9,41.15) 1(90.9,41.96) 1(90.9,122.27) 1(90.9,122.81) 1(90.9,123.07) 1(91.17,41.42) 1(91.17,41.69) 1(91.17,42.22) 1(91.17,42.49) 1(91.17,121.74) 1(91.17,122) 1(91.17,122.54) 1(91.17,123.34) 1(91.44,40.08) 1(91.44,40.35) 1(91.44,40.62) 1(91.44,40.88) 1(91.44,41.15) 1(91.44,41.69) 1(91.44,122.54) 1(91.44,122.81) 1(91.44,123.07) 1(91.44,123.34) 1(91.44,123.61) 1(91.44,123.88) 1(91.71,39.81) 1(91.71,40.88) 1(91.71,41.15) 1(91.71,122.81) 1(91.71,123.07) 1(91.71,123.34) 1(91.71,124.14) 1(91.71,124.41) 1(91.98,39.55) 1(91.98,39.81) 1(91.98,124.41) 1(91.98,124.68) 1(92.24,39.81) 1(92.51,38.48) 1(92.51,38.74) 1(92.51,39.01) 1(92.51,39.55) 1(92.51,124.41) 1(92.51,125.22) 1(92.51,125.48) 1(92.78,38.48) 1(92.78,38.74) 1(92.78,39.01) 1(92.78,39.28) 1(92.78,39.55) 1(92.78,124.95) 1(92.78,125.22) 1(92.78,125.48) 1(92.78,125.75) 1(93.05,37.67) 1(93.05,37.94) 1(93.05,38.74) 1(93.05,39.01) 1(93.05,125.22) 1(93.05,125.48) 1(93.05,125.75) 1(93.05,126.29) 1(93.05,126.55) 1(93.31,37.94) 1(93.31,38.21) 1(93.31,38.48) 1(93.31,125.75) 1(93.31,126.29) 1(93.58,36.87) 1(93.58,37.14) 1(93.58,37.4) 1(93.58,37.94) 1(93.58,126.02) 1(93.58,126.55) 1(93.58,126.82) 1(93.58,127.09) 1(93.58,127.36) 1(93.85,37.14) 1(93.85,126.29) 1(93.85,126.55) 1(93.85,127.09) 1(94.12,36.07) 1(94.12,36.33) 1(94.12,36.6) 1(94.12,37.14) 1(94.12,127.09) 1(94.12,127.62) 1(94.12,127.89) 1(94.12,128.16) 1(94.38,35.8) 1(94.38,127.89) 1(94.38,128.43) 1(94.65,35.53) 1(94.65,127.89) 1(94.65,128.43) 1(94.92,128.43) 1(94.92,128.7) 1(94.92,128.96) 1(94.92,129.23) 1(95.19,34.73) 1(95.19,34.99) 1(95.19,128.7) 1(95.19,128.96) 1(95.19,129.5) 1(95.46,34.19) 1(95.46,34.73) 1(95.46,34.99) 1(95.46,128.7) 1(95.46,128.96) 1(95.46,129.23) 1(95.72,33.66) 1(95.72,33.92) 1(95.72,34.99) 1(95.72,35.26) 1(95.72,129.23) 1(95.72,129.5) 1(95.72,130.03) 1(95.72,130.3) 1(95.99,33.39) 1(95.99,33.92) 1(95.99,34.19) 1(95.99,34.46) 1(95.99,34.73) 1(95.99,129.5) 1(95.99,129.77) 1(95.99,130.03) 1(95.99,130.57) 1(96.26,34.19) 1(96.26,130.03) 1(96.26,130.3) 1(96.26,130.84) 1(96.53,32.85) 1(96.53,33.12) 1(96.53,33.92) 1(96.53,130.3) 1(96.53,131.11) 1(96.53,131.37) 1(96.79,32.59) 1(96.79,32.85) 1(96.79,33.12) 1(96.79,131.11) 1(96.79,131.64) 1(97.06,32.32) 1(97.06,32.59) 1(97.06,33.12) 1(97.06,131.11) 1(97.06,131.37) 1(97.06,131.64) 1(97.06,131.91) 1(97.33,32.05) 1(97.33,32.32) 1(97.33,32.85) 1(97.33,131.37) 1(97.33,131.64) 1(97.33,131.91) 1(97.33,132.18) 1(97.6,31.51) 1(97.6,32.05) 1(97.6,32.59) 1(97.6,132.71) 1(97.86,30.98) 1(97.86,31.25) 1(97.86,32.32) 1(97.86,131.91) 1(97.86,132.18) 1(97.86,132.98) 1(98.13,30.71) 1(98.13,31.25) 1(98.13,31.51) 1(98.13,31.78) 1(98.13,32.05) 1(98.13,132.18) 1(98.13,132.71) 1(98.13,132.98) 1(98.13,133.25) 1(98.4,30.44) 1(98.4,30.98) 1(98.4,31.25) 1(98.4,31.51) 1(98.4,132.44) 1(98.4,132.71) 1(98.4,133.25) 1(98.4,133.51) 1(98.67,30.71) 1(98.67,30.98) 1(98.67,132.98) 1(98.67,133.25) 1(98.67,134.05) 1(98.94,133.78) 1(98.94,134.32) 1(99.2,29.64) 1(99.2,29.91) 1(99.2,30.18) 1(99.2,30.71) 1(99.2,134.59) 1(99.47,29.37) 1(99.47,29.64) 1(99.47,29.91) 1(99.47,134.59) 1(99.47,134.85) 1(99.74,29.11) 1(99.74,29.37) 1(99.74,29.64) 1(99.74,29.91) 1(99.74,134.59) 1(99.74,134.85) 1(99.74,135.12) 1(100.01,28.84) 1(100.01,29.11) 1(100.01,29.37) 1(100.01,134.85) 1(100.01,135.12) 1(100.01,135.39) 1(100.27,28.3) 1(100.27,28.57) 1(100.27,28.84) 1(100.27,135.39) 1(100.27,135.66) 1(100.54,28.03) 1(100.54,28.84) 1(100.54,29.11) 1(100.54,79.7) 1(100.54,79.97) 1(100.54,80.24) 1(100.54,80.51) 1(100.54,80.77) 1(100.54,81.04) 1(100.54,81.31) 1(100.54,81.58) 1(100.54,81.85) 1(100.54,82.11) 1(100.54,82.38) 1(100.54,82.65) 1(100.54,82.92) 1(100.54,83.18) 1(100.54,83.45) 1(100.54,83.72) 1(100.54,83.99) 1(100.54,84.25) 1(100.54,84.52) 1(100.54,135.12) 1(100.54,135.92) 1(100.81,27.77) 1(100.81,28.3) 1(100.81,75.69) 1(100.81,75.96) 1(100.81,76.22) 1(100.81,76.49) 1(100.81,76.76) 1(100.81,77.03) 1(100.81,77.29) 1(100.81,77.56) 1(100.81,77.83) 1(100.81,78.1) 1(100.81,78.36) 1(100.81,78.63) 1(100.81,78.9) 1(100.81,79.17) 1(100.81,79.44) 1(100.81,79.97) 1(100.81,80.24) 1(100.81,80.51) 1(100.81,80.77) 1(100.81,81.04) 1(100.81,81.31) 1(100.81,81.58) 1(100.81,81.85) 1(100.81,82.11) 1(100.81,82.38) 1(100.81,82.65) 1(100.81,82.92) 1(100.81,83.18) 1(100.81,83.45) 1(100.81,83.72) 1(100.81,83.99) 1(100.81,84.25) 1(100.81,84.79) 1(100.81,85.06) 1(100.81,85.33) 1(100.81,85.59) 1(100.81,85.86) 1(100.81,86.13) 1(100.81,86.4) 1(100.81,86.66) 1(100.81,86.93) 1(100.81,87.2) 1(100.81,87.47) 1(100.81,87.74) 1(100.81,88) 1(100.81,88.27) 1(100.81,88.54) 1(100.81,135.39) 1(100.81,135.92) 1(100.81,136.19) 1(100.81,136.46) 1(101.08,28.03) 1(101.08,28.3) 1(101.08,73.55) 1(101.08,73.81) 1(101.08,74.08) 1(101.08,74.35) 1(101.08,74.62) 1(101.08,74.88) 1(101.08,75.15) 1(101.08,75.69) 1(101.08,75.96) 1(101.08,76.22) 1(101.08,76.49) 1(101.08,76.76) 1(101.08,77.03) 1(101.08,77.29) 1(101.08,77.56) 1(101.08,77.83) 1(101.08,78.1) 1(101.08,78.36) 1(101.08,78.63) 1(101.08,78.9) 1(101.08,79.17) 1(101.08,79.97) 1(101.08,80.24) 1(101.08,80.51) 1(101.08,80.77) 1(101.08,81.04) 1(101.08,81.31) 1(101.08,81.58) 1(101.08,81.85) 1(101.08,82.11) 1(101.08,82.38) 1(101.08,82.65) 1(101.08,82.92) 1(101.08,83.18) 1(101.08,83.45) 1(101.08,83.72) 1(101.08,83.99) 1(101.08,84.25) 1(101.08,85.06) 1(101.08,85.33) 1(101.08,85.59) 1(101.08,85.86) 1(101.08,86.13) 1(101.08,86.4) 1(101.08,86.66) 1(101.08,86.93) 1(101.08,87.2) 1(101.08,87.47) 1(101.08,87.74) 1(101.08,88) 1(101.08,88.27) 1(101.08,88.54) 1(101.08,88.81) 1(101.08,89.07) 1(101.08,89.34) 1(101.08,89.61) 1(101.08,89.88) 1(101.08,90.14) 1(101.08,90.41) 1(101.08,90.68) 1(101.08,90.95) 1(101.08,135.92) 1(101.08,136.46) 1(101.08,136.73) 1(101.35,27.23) 1(101.35,28.03) 1(101.35,71.67) 1(101.35,71.94) 1(101.35,72.21) 1(101.35,72.48) 1(101.35,72.74) 1(101.35,73.01) 1(101.35,73.55) 1(101.35,73.81) 1(101.35,74.08) 1(101.35,74.35) 1(101.35,74.62) 1(101.35,74.88) 1(101.35,75.15) 1(101.35,75.42) 1(101.35,75.69) 1(101.35,75.96) 1(101.35,76.22) 1(101.35,76.49) 1(101.35,76.76) 1(101.35,77.03) 1(101.35,77.29) 1(101.35,77.56) 1(101.35,77.83) 1(101.35,78.1) 1(101.35,78.36) 1(101.35,78.63) 1(101.35,78.9) 1(101.35,79.17) 1(101.35,85.06) 1(101.35,85.33) 1(101.35,85.59) 1(101.35,85.86) 1(101.35,86.13) 1(101.35,86.4) 1(101.35,86.66) 1(101.35,86.93) 1(101.35,87.2) 1(101.35,87.47) 1(101.35,87.74) 1(101.35,88) 1(101.35,88.27) 1(101.35,88.54) 1(101.35,89.07) 1(101.35,89.34) 1(101.35,89.61) 1(101.35,89.88) 1(101.35,90.14) 1(101.35,90.41) 1(101.35,90.68) 1(101.35,90.95) 1(101.35,91.48) 1(101.35,91.75) 1(101.35,92.02) 1(101.35,92.29) 1(101.35,92.55) 1(101.35,136.46) 1(101.35,136.99) 1(101.35,137.26) 1(101.61,26.7) 1(101.61,26.96) 1(101.61,27.5) 1(101.61,73.28) 1(101.61,73.55) 1(101.61,73.81) 1(101.61,74.08) 1(101.61,74.35) 1(101.61,74.62) 1(101.61,74.88) 1(101.61,75.15) 1(101.61,89.34) 1(101.61,89.61) 1(101.61,89.88) 1(101.61,90.14) 1(101.61,90.41) 1(101.61,90.68) 1(101.61,90.95) 1(101.61,91.22) 1(101.88,26.43) 1(101.88,26.96) 1(101.88,70.33) 1(101.88,71.14) 1(101.88,71.67) 1(101.88,71.94) 1(101.88,72.21) 1(101.88,72.48) 1(101.88,72.74) 1(101.88,73.01) 1(101.88,89.07) 1(101.88,91.22) 1(101.88,91.48) 1(101.88,91.75) 1(101.88,92.02) 1(101.88,92.29) 1(101.88,92.55) 1(101.88,93.09) 1(101.88,93.89) 1(101.88,137.53) 1(102.15,26.7) 1(102.15,26.96) 1(102.15,67.92) 1(102.15,68.19) 1(102.15,68.46) 1(102.15,70.33) 1(102.15,71.4) 1(102.15,71.67) 1(102.15,71.94) 1(102.15,72.21) 1(102.15,72.48) 1(102.15,72.74) 1(102.15,73.01) 1(102.15,91.22) 1(102.15,91.48) 1(102.15,91.75) 1(102.15,92.02) 1(102.15,92.29) 1(102.15,92.55) 1(102.15,92.82) 1(102.15,93.09) 1(102.15,93.89) 1(102.15,95.77) 1(102.15,96.57) 1(102.15,137.53) 1(102.15,137.8) 1(102.42,26.16) 1(102.42,26.43) 1(102.42,26.7) 1(102.42,66.59) 1(102.42,66.85) 1(102.42,67.39) 1(102.42,67.92) 1(102.42,68.19) 1(102.42,68.46) 1(102.42,69.8) 1(102.42,70.07) 1(102.42,70.33) 1(102.42,70.6) 1(102.42,70.87) 1(102.42,93.09) 1(102.42,93.36) 1(102.42,93.62) 1(102.42,93.89) 1(102.42,94.16) 1(102.42,94.43) 1(102.42,95.77) 1(102.42,96.57) 1(102.42,97.11) 1(102.42,97.37) 1(102.42,97.64) 1(102.42,137.53) 1(102.42,137.8) 1(102.42,138.07) 1(102.68,25.62) 1(102.68,25.89) 1(102.68,26.16) 1(102.68,26.43) 1(102.68,65.25) 1(102.68,65.51) 1(102.68,65.78) 1(102.68,66.05) 1(102.68,66.59) 1(102.68,66.85) 